# Altium footprint library PcbLib_Discrete_ThroughHole.PcbLib: 104 footprints (part 3 of 7)
Each footprint in its own frame and in the unit in brackets; x right, y up, seen from the top. Pads: shape width x height; smd on the part's side, far side on the other; paste and mask are expansions set on the pad; w line width, h text height; cw(c..) or ccw(c..) is an arc to the next point about the centre after c.
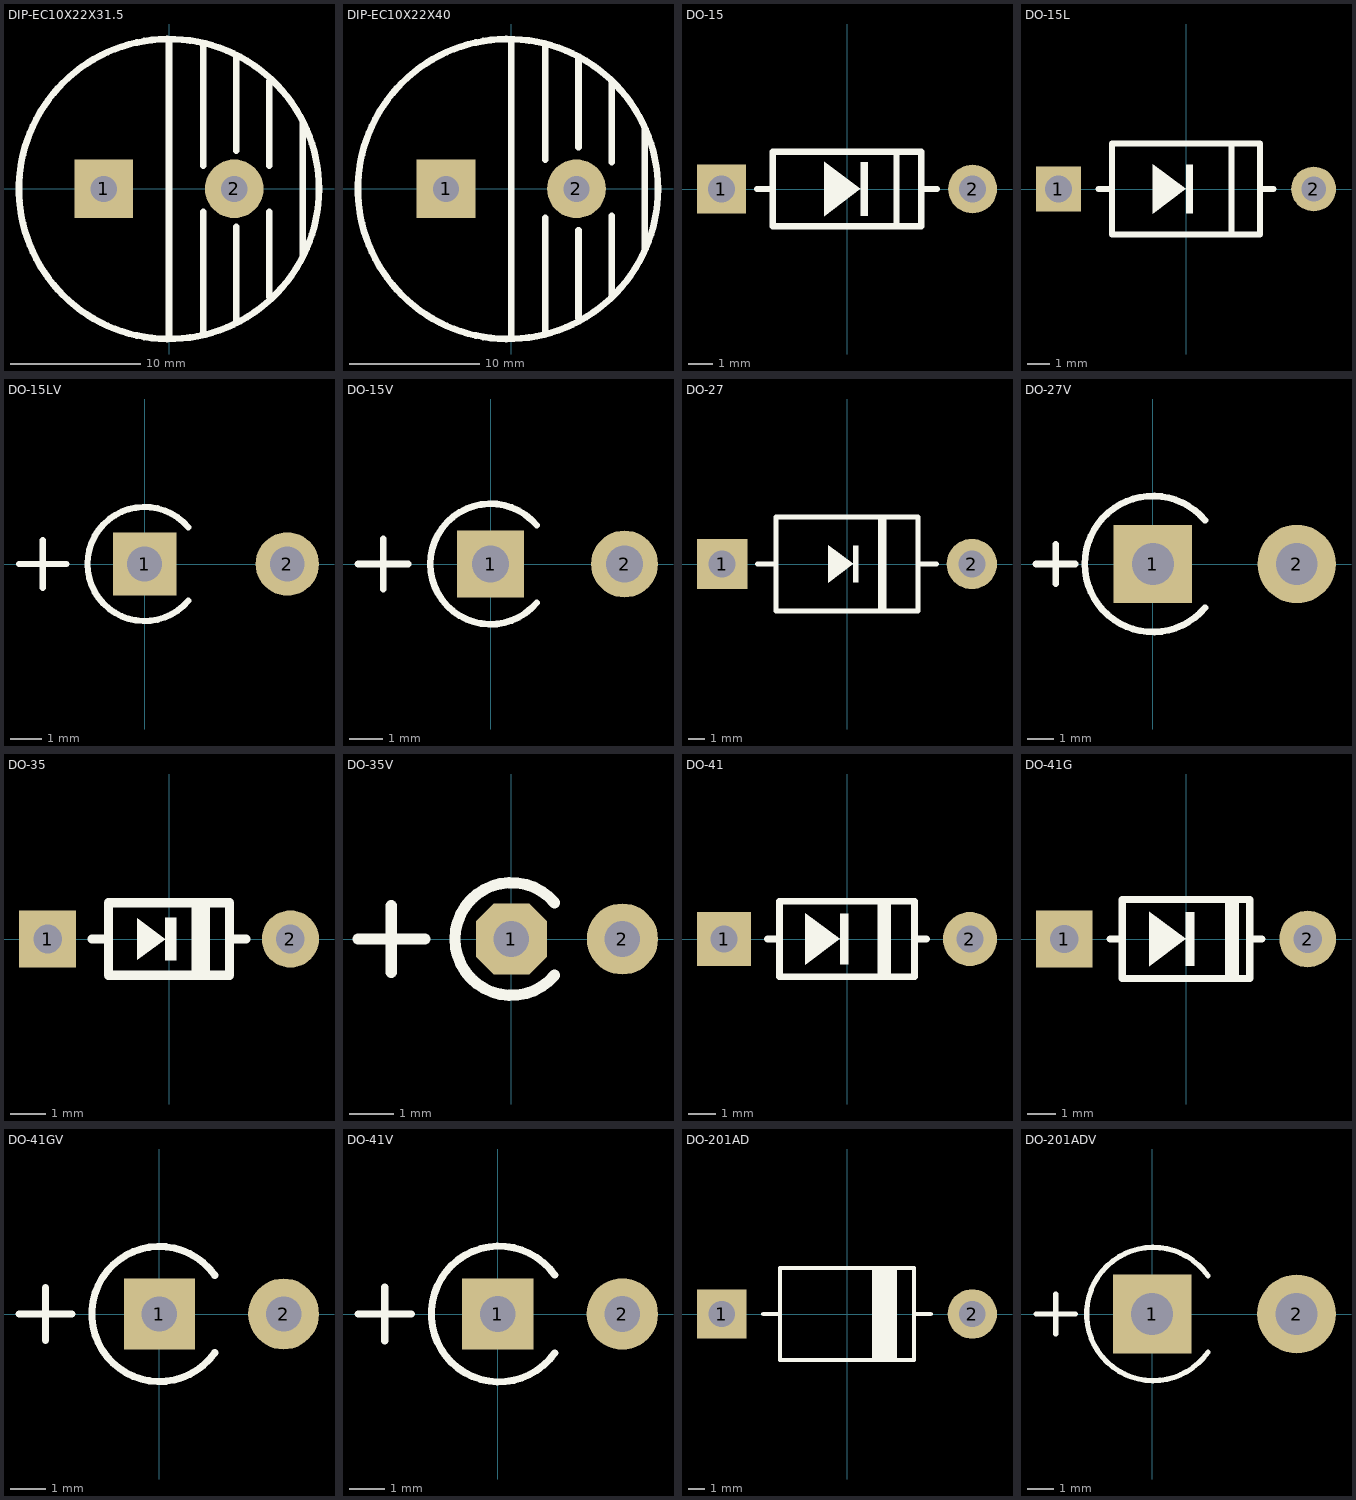
[diagram p2: the footprints below, top view; thin cyan lines are the x and y axes]

## DIP-EC10X22X31.5 [mm]
pads (2):
  rect 4.5x4.5 hole 2: 1(-5,0)
  round 4.5 hole 2: 2(5,0)
Top Overlay:
  circle w0.508: c0,-0.013 r11.5
  lines w0.508: 0,-11.25 0,11.25 ; 2.62,-10.922 2.62,-1.778 ; 2.62,1.778 2.62,10.922 ; 5.16,-10.16 5.16,-2.921 ; 5.16,2.921 5.16,10.16 ; 7.7,-8.255 7.7,-1.778 ; 7.7,1.778 7.7,8.255 ; 10.24,-5.08 10.24,5.08
3D body "CAP 10X22X31.5.STEP": height 31.53, standoff -3.38, extent -11.005,-10.996 11.005,10.996

## DIP-EC10X22X40 [mm]
pads (2):
  rect 4.5x4.5 hole 2: 1(-5,0)
  round 4.5 hole 2: 2(5,0)
Top Overlay:
  circle w0.508: c-0.248,-0.013 r11.5
  lines w0.508: 0,-11.25 0,11.25 ; 2.62,-11.024 2.62,-2.235 ; 2.62,2.235 2.62,11.024 ; 5.16,-9.906 5.16,-3.175 ; 5.16,3.175 5.16,9.906 ; 7.7,-8.179 7.7,-2.057 ; 7.7,2.057 7.7,8.179 ; 10.24,-4.572 10.24,4.648
3D body "CAP 10X22X40.STEP": height 40.03, standoff -3.38, extent -11.005,-10.999 11.005,10.999

## DO-15 [mm]
pads (2):
  rect 2x2 hole 1.1: 1(-5.15,0)
  round 2 hole 1.1: 2(5.15,0)
Top Overlay:
  region: 0.868,1.1 0.548,1.1 0.548,-1.1 0.868,-1.1
  region: -0.932,-1.11 0.548,0 -0.932,1.11
  lines w0.254: -3.677,0 -3.048,0 ; 2.032,-1.524 2.032,1.524 ; 3.048,0 3.677,0 ; -3.048,-1.524 -3.048,1.524 3.048,1.524 3.048,-1.524 -3.048,-1.524
3D body "DO-15.STEP": height 3.35, standoff -3.45, extent -5.55,-1.651 5.55,1.651

## DO-15L [mm]
pads (2):
  rect 2x2 hole 1.2: 1(-5.7,0)
  round 2 hole 1.1: 2(5.7,0)
Top Overlay:
  region: 0.318,1.1 -0.002,1.1 -0.002,-1.1 0.318,-1.1
  region: -1.482,-1.11 -0.002,0 -1.482,1.11
  lines w0.254: -3.912,0 -3.302,0 ; 2.032,-2.032 2.032,2.032 ; 3.302,0 3.912,0 ; -3.302,-2.032 -3.302,2.032 3.302,2.032 3.302,-2.032 -3.302,-2.032
3D body "DO-15L.STEP": height 4.05, standoff -3.45, extent -6.1,-2.001 6.1,2.001

## DO-15LV [mm]
pads (2):
  rect 2x2 hole 1.1: 1(0,0)
  round 2 hole 1.1: 2(4.5,0)
Top Overlay:
  lines w0.2: -3.96,0 -2.46,0 ; -3.21,-0.75 -3.21,0.75 ; 1.379,-1.157 cw(c0,0) 1.379,1.157
3D body "DO-15LV.STEP": height 9.45, standoff -3.45, extent -2.053,-2.032 4.847,1.97

## DO-15V [mm]
pads (2):
  rect 2x2 hole 1.1: 1(0,0)
  round 2 hole 1.1: 2(4,0)
Top Overlay:
  lines w0.2: -3.96,0 -2.46,0 ; -3.21,-0.75 -3.21,0.75 ; 1.379,-1.157 cw(c0,0) 1.379,1.157
3D body "DO-15V.STEP": height 8.35, standoff -3.45, extent -1.629,-1.651 4.423,1.651

## DO-27 [mm]
pads (2):
  rect 3x3 hole 1.6: 1(-7.45,0)
  round 3 hole 1.6: 2(7.45,0)
Top Overlay:
  region: 2.354,2.743 1.846,2.743 1.846,-2.718 2.354,-2.718
  region: 0.684,1.1 0.364,1.1 0.364,-1.1 0.684,-1.1
  region: -1.116,-1.11 0.364,0 -1.116,1.11
  lines w0.305: -5.334,0 -4.318,0 ; 4.318,0 5.334,0 ; -4.246,-2.794 -4.246,2.794 4.246,2.794 4.246,-2.794 -4.246,-2.794
3D body "DO-27.STEP": height 5.25, standoff -3.45, extent -8.143,-2.6 8.057,2.6

## DO-27V [mm]
pads (2):
  rect 3x3 hole 1.6: 1(0,0)
  round 3 hole 1.6: 2(5.5,0)
Top Overlay:
  lines w0.254: -4.468,0 -2.968,0 ; -3.718,-0.75 -3.718,0.75 ; 1.992,-1.671 cw(c0,0) 1.992,1.671
3D body "DO-27V.STEP": height 11.7, standoff -3.45, extent -2.598,-2.534 6.154,2.667

## DO-35 [mm]
pads (2):
  rect 1.6x1.6 hole 0.8: 1(-3.4,0)
  round 1.6 hole 0.8: 2(3.4,0)
Top Overlay:
  rectangle: 0.635,-1.016 1.143,1.016
  region: 0.212,0.6 -0.108,0.6 -0.108,-0.6 0.212,-0.6
  region: -0.888,-0.585 -0.108,0 -0.888,0.585
  lines w0.254: -2.155,0 -1.747,0 ; 1.655,-1.016 -1.698,-1.016 -1.698,1.016 1.698,1.016 1.698,-1.016 ; 1.747,0 2.155,0
3D body "DO-35.STEP": height 1.85, standoff -3.45, extent -3.679,-0.913 3.621,0.889

## DO-35V [mm]
pads (2):
  oct 1.6x1.6 hole 0.8: 1(0,0)
  round 1.6 hole 0.8: 2(2.5,0)
Top Overlay:
  lines w0.254: -3.452,0 -1.952,0 ; -2.702,-0.75 -2.702,0.75 ; 0.973,-0.816 cw(c0,0) 0.973,0.816
3D body "DO-35V.STEP": height 5.15, standoff -3.5, extent -0.81,-0.913 2.842,0.889

## DO-41 [mm]
pads (2):
  rect 2x2 hole 1: 1(-4.55,0)
  round 2 hole 1: 2(4.55,0)
Top Overlay:
  region: 0.054,0.95 -0.266,0.95 -0.266,-0.95 0.054,-0.95
  rectangle: 1.121,-1.346 1.629,1.321
  region: -1.546,-0.96 -0.266,0 -1.546,0.96
  lines w0.254: -2.939,0 -2.531,0 ; -2.504,-1.397 -2.504,1.397 2.46,1.397 ; -2.46,-1.397 2.504,-1.397 2.504,1.397 ; 2.531,0 2.939,0
3D body "DO-41.STEP": height 2.65, standoff -3.45, extent -4.972,-1.27 4.928,1.332

## DO-41G [mm]
pads (2):
  rect 2x2 hole 1: 1(-4.3,0)
  round 2 hole 1: 2(4.3,0)
Top Overlay:
  rectangle: 1.371,-1.346 1.879,1.321
  region: 0.304,0.95 -0.016,0.95 -0.016,-0.95 0.304,-0.95
  region: -1.296,-0.96 -0.016,0 -1.296,0.96
  lines w0.254: -2.689,0 -2.281,0 ; 2.281,0 2.689,0 ; -2.254,-1.397 2.254,-1.397 2.254,1.397 -2.254,1.397 -2.254,-1.397
3D body "DO-41G.STEP": height 2.55, standoff -3.45, extent -4.809,-1.232 4.591,1.27

## DO-41GV [mm]
pads (2):
  rect 2x2 hole 1: 1(0,0)
  round 2 hole 1: 2(3.5,0)
Top Overlay:
  lines w0.2: -3.96,0 -2.46,0 ; -3.21,-0.75 -3.21,0.75 ; 1.56,-1.093 cw(c0,0) 1.56,1.093
3D body "DO-41GV.STEP": height 6.4, standoff -3.5, extent -1.27,-1.27 3.881,1.232

## DO-41V [mm]
pads (2):
  rect 2x2 hole 1: 1(0,0)
  round 2 hole 1: 2(3.5,0)
Top Overlay:
  lines w0.2: -3.92,0 -2.42,0 ; -3.17,-0.75 -3.17,0.75 ; 1.6,-1.093 cw(c0.04,0) 1.6,1.093
3D body "DO-41V.STEP": height 6.9, standoff -3.5, extent -1.331,-1.332 3.871,1.27

## DO-201AD [mm]
pads (2):
  rect 3x3 hole 1.6: 1(-7.6,0)
  round 3 hole 1.6: 2(7.6,0)
Top Overlay:
  rectangle: 1.524,-2.794 3.048,2.794
  lines w0.254: -5.08,0 -4.064,0 ; 4.064,0 5.08,0 ; -4.064,-2.794 -4.064,2.794 4.064,2.794 4.064,-2.794 -4.064,-2.794
3D body "DO-201AD.STEP": height 5.25, standoff -3.45, extent -8.27,-2.6 8.23,2.6

## DO-201ADV [mm]
pads (2):
  rect 3x3 hole 1.6: 1(0,0)
  round 3 hole 1.6: 2(5.5,0)
Top Overlay:
  lines w0.2: -4.428,0 -2.928,0 ; -3.678,-0.75 -3.678,0.75 ; 2.121,-1.457 cw(c0.04,0) 2.121,1.457
3D body "DO-201ADV.STEP": height 12, standoff -3.45, extent -2.598,-2.667 6.154,2.534